# Altium footprint library TarabusLibrary.PcbLib: 591 footprints (part 1 of 37)
Each footprint in its own frame and in the unit in brackets; x right, y up, seen from the top. Pads: shape width x height; smd on the part's side, far side on the other; paste and mask are expansions set on the pad; w line width, h text height; cw(c..) or ccw(c..) is an arc to the next point about the centre after c.
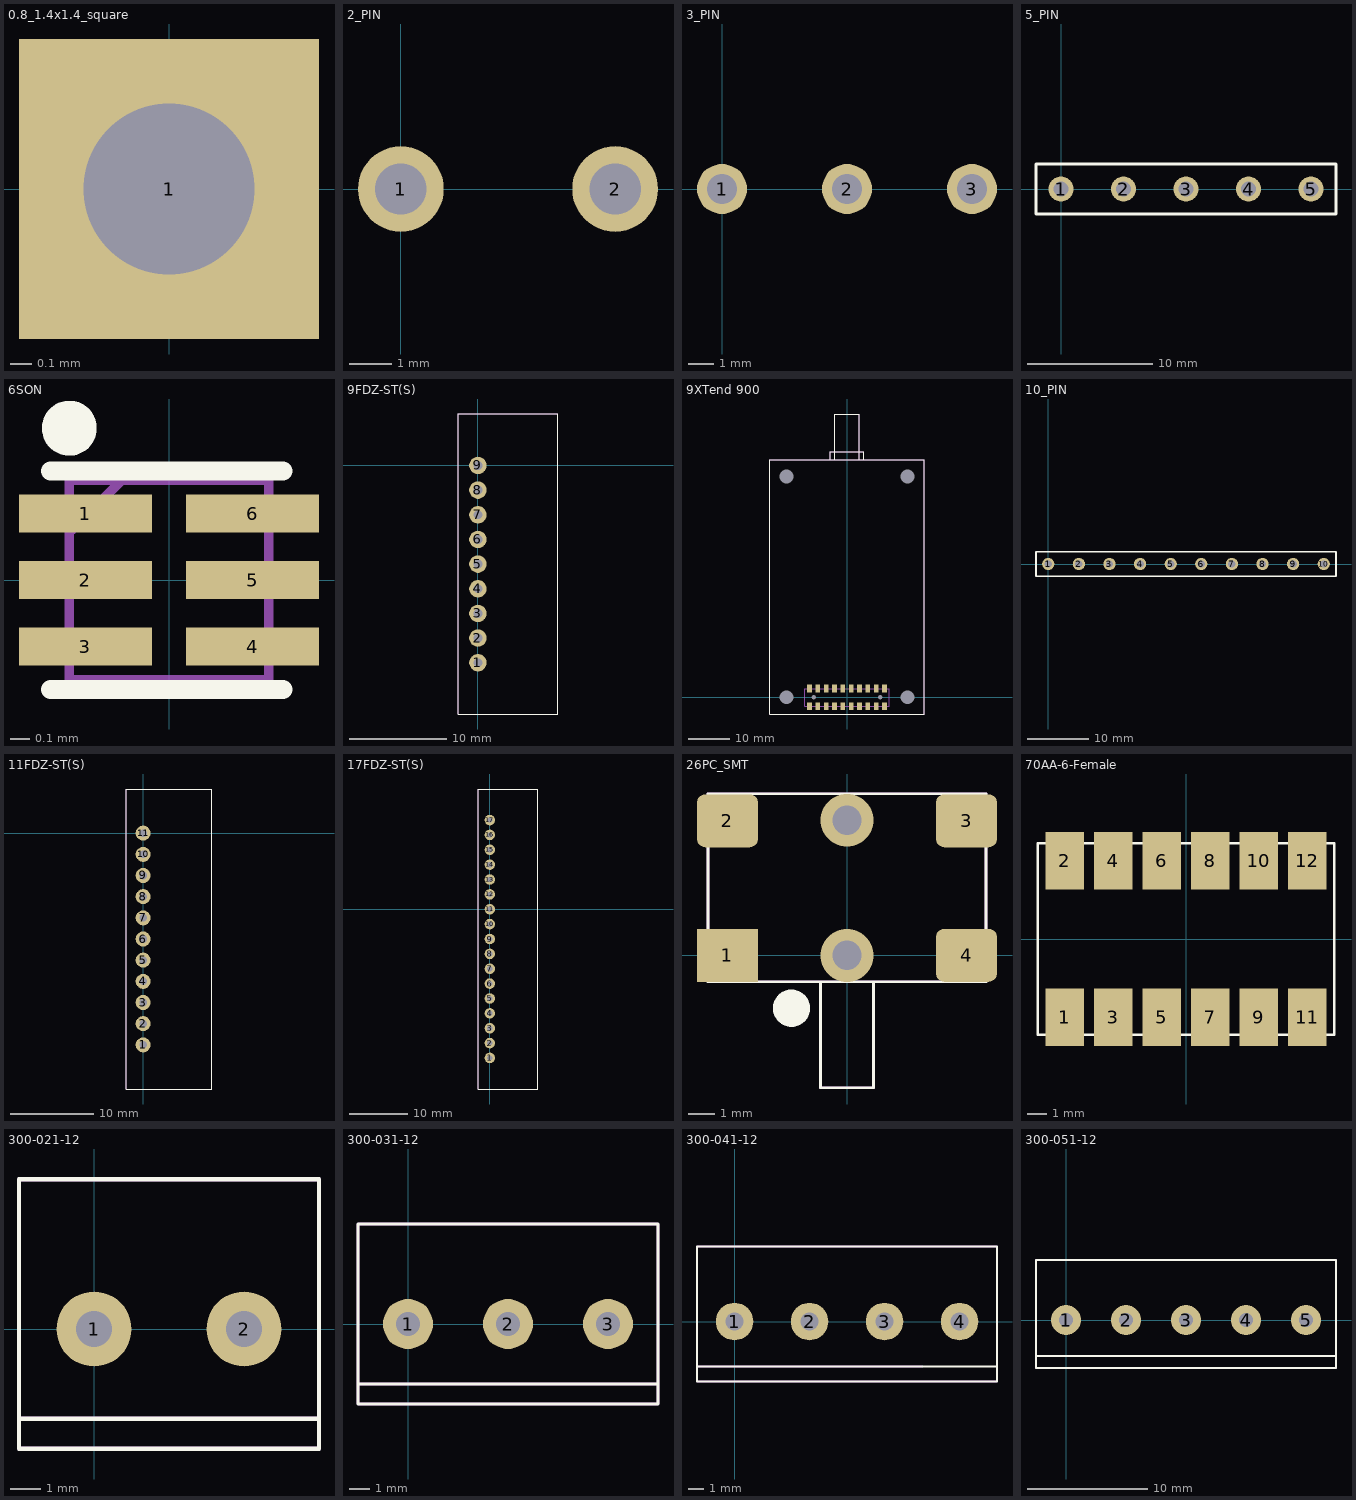
[diagram p0: the footprints below, top view; thin cyan lines are the x and y axes]

## 0.8_1.4x1.4_square [mm]
pads (1):
  rect 1.4x1.4 hole 0.8: 1(0,0)

## 2_PIN [mm]
pads (2):
  round 2 hole 1.2: 1(0,0) 2(5,0)

## 3_PIN [mm]
pads (3):
  round 2 hole 1.2: 1(0,0) 2(5,0) 3(10,0)

## 5_PIN [mm]
pads (5):
  round 2 hole 1.2: 1(0,0) 2(5,0) 3(10,0) 4(15,0) 5(20,0)
Top Overlay:
  lines w0.254: -2,-2 -2,2 22,2 22,-2 -2,-2

## 6SON [mm] "PSON, 6-Leads, Body 3x4 mm, Pitch 0.8mm, NSC Recommended"
height 0.4
pads (6):
  rect 0.7x0.2 smd mask+0.051: 1(-0.44,0.35) 2(-0.44,0) 3(-0.44,-0.35) 4(0.44,-0.35) 5(0.44,0) 6(0.44,0.35)
Top Overlay:
  circle w0.15: c-0.525,0.8 r0.069
  lines w0.1: -0.625,-0.575 0.6,-0.575 ; -0.625,0.575 0.6,0.575
Mechanical 7:
  lines w0.05: -0.513,0.262 -0.25,0.525 -0.2,0.525 ; -0.525,-0.525 -0.525,0.525 0.525,0.525 0.525,-0.525 -0.525,-0.525
Mechanical 9:
  lines w0.05: -0.525,-0.525 0.525,-0.525 0.525,0.525 -0.525,0.525 -0.525,-0.525
Mechanical 10:
  text ".Comment" at -1,1 h0.6
  text ".Designator" at -1,-1.125 h0.6
3D body: height 0.4, standoff 0.05, extent -0.525,-0.525 0.525,0.525

## 9FDZ-ST(S) [mm]
pads (9):
  round 1.8 hole 0.9 mask+0: 1(0,-20.32) 2(0,-17.78) 3(0,-15.24) 4(0,-12.7) 5(0,-10.16) 6(0,-7.62) 7(0,-5.08) 8(0,-2.54) 9(0,0)
Top Overlay:
  lines w0.1: -2,-25.6 -2,5.3 8.2,5.3 8.2,-25.6 -2,-25.6
Mechanical 7:
  lines w0.1: -2,-25.6 8.2,-25.6 8.2,5.3 -2,5.3 -2,-25.6
Mechanical 10:
  text ".Designator" at 4.8,6.5 h0.8
  text ".Comment" at 4.9,5.7 h0.6
3D body: height 7.7, standoff 0, extent -2,-25.6 8.2,5.3

## 9XTend 900 [mm]
pads (26):
  round 1.5 hole 3.3: 0(-14.5,0) 0(-14.5,53) 0(14.5,0) 0(14.5,53)
  round 0.8 hole 1.1: 0(-8,0) 0(8,0)
  rect 1.15x1.9 smd: 1(-9,-2.15) 2(-9,2.15) 3(-7,-2.15) 4(-7,2.15) 5(-5,-2.15) 6(-5,2.15) 7(-3,-2.15) 8(-3,2.15) 9(-1,-2.15) 10(-1,2.15) 11(1,-2.15) 12(1,2.15) 13(3,-2.15) 14(3,2.15) 15(5,-2.15) 16(5,2.15) 17(7,-2.15) 18(7,2.15) 19(9,-2.15) 20(9,2.15)
Top Overlay:
  lines w0.2: -4,57 -4,59 4,59 4,57 ; -18.5,-4 18.5,-4 18.5,57 -18.5,57 -18.5,-4 ; -3,57 -3,68 3,68 3,57 -3,57
Mechanical 7:
  lines w0.2: -4,57 -4,59 4,59 4,57 ; -18.5,-4 -18.5,57 18.5,57 18.5,-4 -18.5,-4 ; -10.1,-2.1 10.1,-2.1 10.1,2.1 -10.1,2.1 -10.1,-2.1 ; -3,57 3,57 3,68 -3,68 -3,57
3D body: height 4.65, standoff 0, extent -10.1,-2.1 10.1,2.1
3D body "XT09-MI.STEP": height 9.09, standoff 1, extent -18.5,-4 18.5,57.051
3D body: height 9.99, standoff 4, extent -2.997,57 3,68
3D body: height 11, standoff 3, extent -3.999,57 3.999,59

## 10_PIN [mm]
pads (10):
  round 2 hole 1.2: 1(0,0) 2(5,0) 3(10,0) 4(15,0) 5(20,0) 6(25,0) 7(30,0) 8(35,0) 9(40,0) 10(45,0)
Top Overlay:
  lines w0.254: -2,-2 -2,2 47,2 47,-2 -2,-2

## 11FDZ-ST(S) [mm]
pads (11):
  round 1.8 hole 0.9 mask+0: 1(0,-25.4) 2(0,-22.86) 3(0,-20.32) 4(0,-17.78) 5(0,-15.24) 6(0,-12.7) 7(0,-10.16) 8(0,-7.62) 9(0,-5.08) 10(0,-2.54) 11(0,0)
Top Overlay:
  lines w0.1: -2,-30.7 8.2,-30.7 8.2,5.3 -2,5.3 -2,-30.7
Mechanical 7:
  lines w0.1: -2,-30.7 -2,5.3 8.2,5.3 8.2,-30.7 -2,-30.7
Mechanical 10:
  text ".Designator" at 3.8,6.5 h0.8
  text ".Comment" at 3.9,5.7 h0.6
3D body: height 7.7, standoff 0, extent -2,-30.7 8.2,5.3

## 17FDZ-ST(S) [mm]
pads (17):
  round 1.8 hole 0.9 mask+0: 1(0,-25.4) 2(0,-22.86) 3(0,-20.32) 4(0,-17.78) 5(0,-15.24) 6(0,-12.7) 7(0,-10.16) 8(0,-7.62) 9(0,-5.08) 10(0,-2.54) 11(0,0) 12(0,2.54) 13(0,5.08) 14(0,7.62) 15(0,10.16) 16(0,12.7) 17(0,15.24)
Top Overlay:
  lines w0.1: -2,-30.7 -2,20.54 8.2,20.54 8.2,-30.7 -2,-30.7
Mechanical 7:
  lines w0.1: -2,-30.7 8.2,-30.7 8.2,20.54 -2,20.54 -2,-30.7
Mechanical 10:
  text ".Comment" at 4.1,21.1 h0.6
  text ".Designator" at 4,21.9 h0.8
3D body: height 7.7, standoff 0, extent -2,-30.7 8.2,20.5

## 26PC_SMT [mm]
height 8
pads (4):
  rect 2.3x2 smd: 1(-4.515,0)
  rrect30% 2.3x2 smd: 2(-4.515,5.08) 3(4.515,5.08) 4(4.515,0)
via 0,5.1 diameter 2 hole 1.1
via 0,0 diameter 2 hole 1.1
Top Overlay:
  circle w1: c-2.1,-2 r0.2
  lines w0.1: -1,-1 -1,-5 1,-5 1,-1 ; -5.25,-1 5.25,-1 5.25,6.1 -5.25,6.1 -5.25,-1
Mechanical 7:
  lines w0.1: -1,-1 -1,-5 1,-5 1,-1 ; -5.25,-1 -5.25,6.1 5.25,6.1 5.25,-1 -5.25,-1
3D body: height 7, standoff 0, extent -1,-5 1,-1
3D body: height 2.75, standoff 0, extent 3.275,-1.1 5.75,1.1
3D body: height 2.75, standoff 0, extent 3.275,4 5.75,6.2
3D body: height 2.75, standoff 0, extent -5.725,4 -3.25,6.2
3D body: height 2.75, standoff 0, extent -5.75,-1.1 -3.275,1.1
3D body: height 7.87, standoff 0, extent -3.4,-1 3.4,6.1

## 70AA-6-Female [mm]
height 1.27
pads (12):
  rect 2x3 smd: 1(-6.35,-4.1) 2(-6.35,4.1) 3(-3.81,-4.1) 4(-3.81,4.1) 5(-1.27,-4.1) 6(-1.27,4.1) 7(1.27,-4.1) 8(1.27,4.1) 9(3.81,-4.1) 10(3.81,4.1) 11(6.35,-4.1) 12(6.35,4.1)
Top Overlay:
  lines w0.127: -7.75,-5 7.75,-5 7.75,5 -7.75,5 -7.75,-5
3D body "70AA female 6.STEP": height 1.27, standoff -0.84, extent -7.57,-5 7.57,5

## 300-021-12 [mm]
pads (2):
  round 2.5 hole 1.2: 1(0,0) 2(5,0)
Top Overlay:
  lines w0.15: -2.5,-3 7.5,-3 ; -2.5,-4 -2.5,5 7.5,5 7.5,-4 -2.5,-4
Mechanical 7:
  lines w0.15: -2.5,-3 7.5,-3 ; -2.5,-4 7.5,-4 7.5,5 -2.5,5 -2.5,-4
Mechanical 10:
  text ".Comment" at 5.52,-4.71 h0.6
  text ".Designator" at 4.52,5.25 h0.8
3D body: height 12.5, standoff 0, extent -2.5,-4 7.5,5

## 300-031-12 [mm]
pads (3):
  round 2.5 hole 1.2: 1(0,0) 2(5,0) 3(10,0)
Top Overlay:
  lines w0.15: -2.5,-3 12.5,-3 ; -2.5,-4 12.5,-4 12.5,5 -2.5,5 -2.5,-4
Mechanical 7:
  lines w0.15: -2.5,-3 12.5,-3 ; -2.5,-4 -2.5,5 12.5,5 12.5,-4 -2.5,-4
Mechanical 10:
  text ".Designator" at 4.52,5.25 h0.8
  text ".Comment" at 5.52,-4.71 h0.6
3D body: height 12.5, standoff 0, extent -2.5,-4 12.5,5

## 300-041-12 [mm]
pads (4):
  round 2.5 hole 1.2: 1(0,0) 2(5,0) 3(10,0) 4(15,0)
Top Overlay:
  lines w0.15: -2.5,-3 17.5,-3 ; -2.5,-4 17.5,-4 17.5,5 -2.5,5 -2.5,-4
Mechanical 7:
  lines w0.15: -2.5,-3 12.5,-3 ; -2.5,-4 -2.5,5 17.5,5 17.5,-4 -2.5,-4
Mechanical 10:
  text ".Designator" at 4.52,5.25 h0.8
  text ".Comment" at 5.52,-4.71 h0.6
3D body: height 12.5, standoff 0, extent -2.5,-4 17.5,5

## 300-051-12 [mm]
pads (5):
  round 2.5 hole 1.2: 1(0,0) 2(5,0) 3(10,0) 4(15,0) 5(20,0)
Top Overlay:
  lines w0.15: -2.5,-3 22.5,-3 ; -2.5,-4 22.5,-4 22.5,5 -2.5,5 -2.5,-4
Mechanical 7:
  lines w0.15: -2.5,-3 22.5,-3 ; -2.5,-4 -2.5,5 22.5,5 22.5,-4 -2.5,-4
Mechanical 10:
  text ".Designator" at 4.52,5.25 h0.8
  text ".Comment" at 5.52,-4.71 h0.6
3D body: height 12.5, standoff 0, extent -2.5,-4 22.5,5